# Altium schematic symbol library 13-Logicold 逻辑 IC.SchLib: 297 symbols (part 11 of 30) (continued)
## PIC16F877A-I/PT (continued)
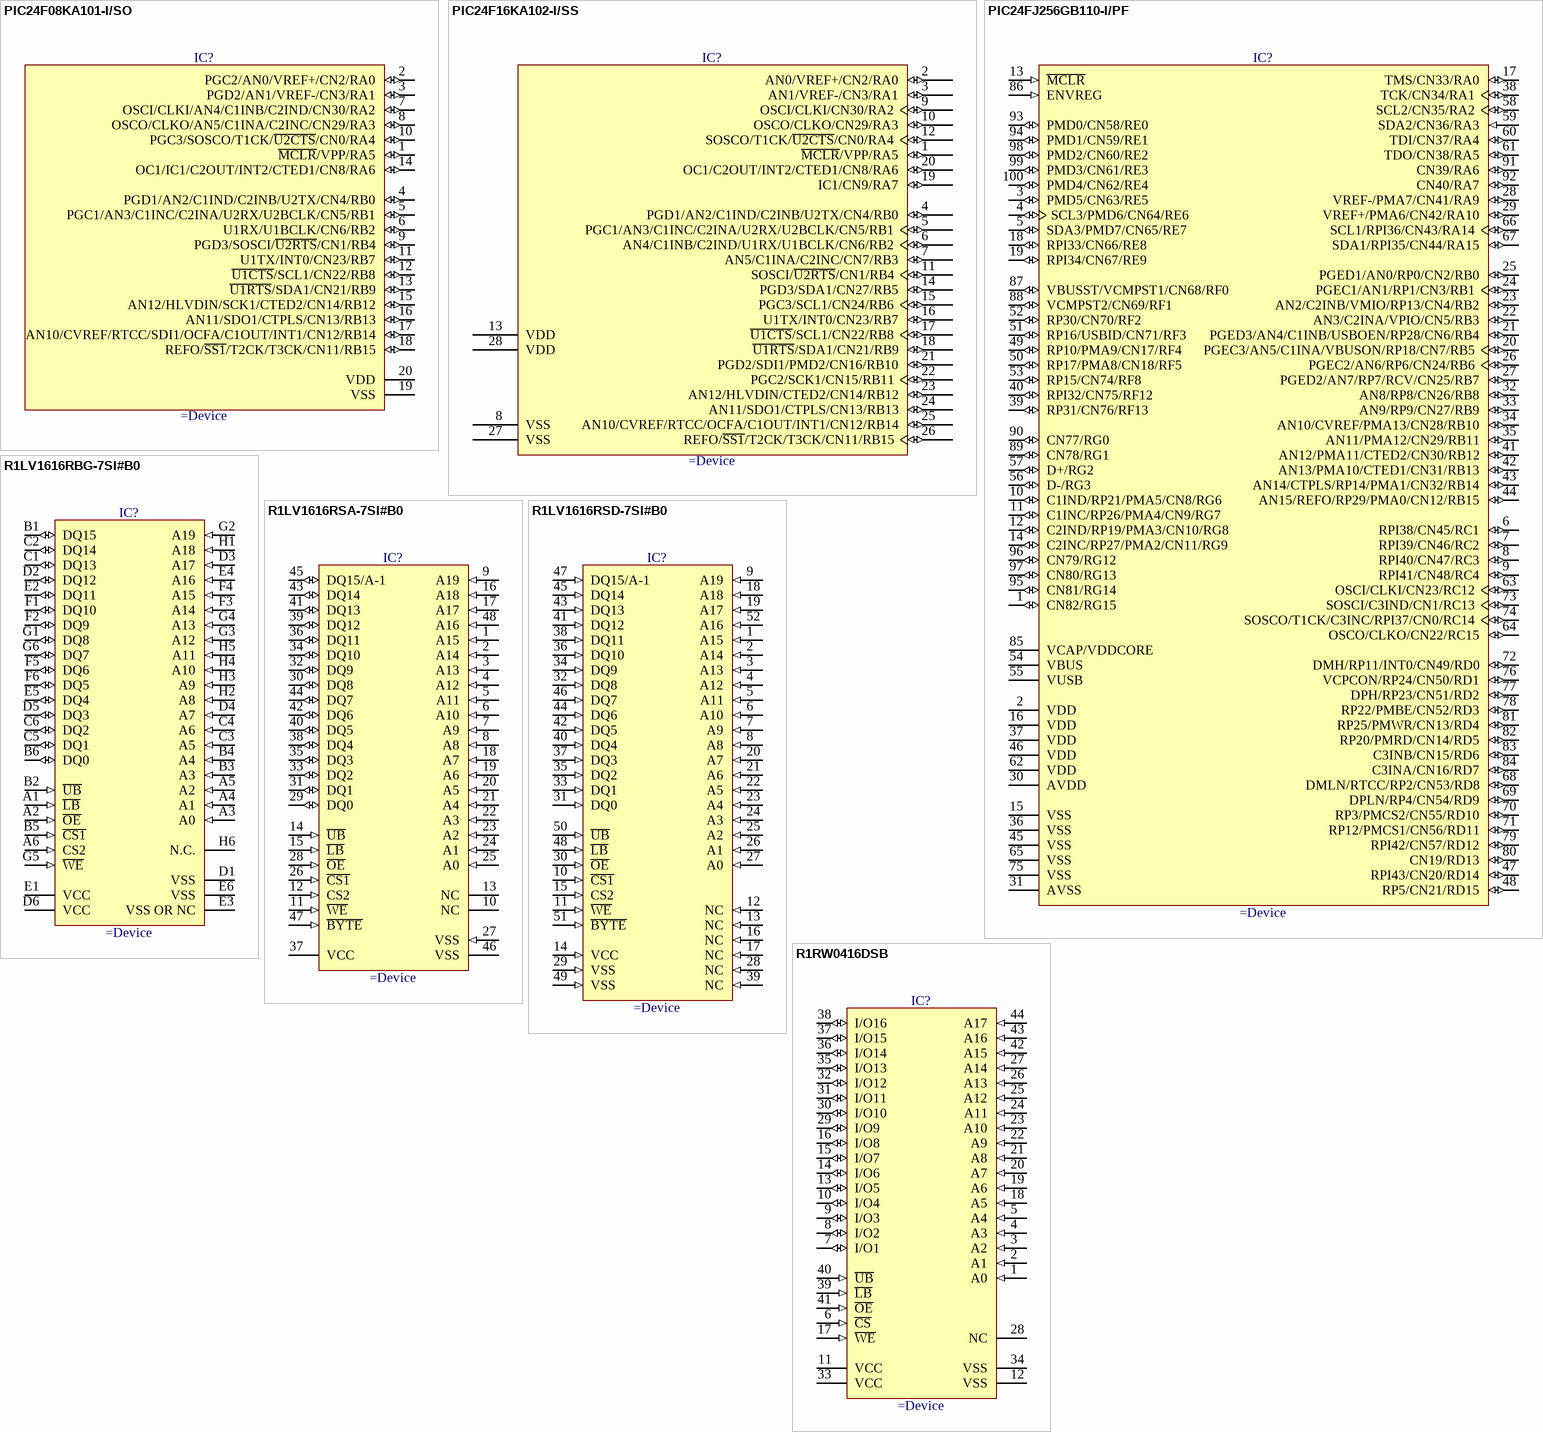
[diagram p68: symbols PIC24F08KA101-I/SO to R1RW0416DSB]

## PIC24F08KA101-I/SO
designator IC?
16-Bit Flash Microcontroller with nanoWatt XLP Technology, 8KB Flash, 1.5KB SRAM, 20-Pin SOIC, Industrial Temperature
pins: 1 ~{MCLR}/VPP/RA5 (io), 2 PGC2/AN0/VREF+/CN2/RA0 (io), 3 PGD2/AN1/VREF-/CN3/RA1 (io), 4 PGD1/AN2/C1IND/C2INB/U2TX/CN4/RB0 (io), 5 PGC1/AN3/C1INC/C2INA/U2RX/U2BCLK/CN5/RB1 (io), 6 U1RX/U1BCLK/CN6/RB2 (io), 7 OSCI/CLKI/AN4/C1INB/C2IND/CN30/RA2 (io), 8 OSCO/CLKO/AN5/C1INA/C2INC/CN29/RA3 (io), 9 PGD3/SOSCI/~{U2RTS}/CN1/RB4 (io), 10 PGC3/SOSCO/T1CK/~{U2CTS}/CN0/RA4 (io), 11 U1TX/INT0/CN23/RB7 (io), 12 ~{U1CTS}/SCL1/CN22/RB8 (io), 13 ~{U1RTS}/SDA1/CN21/RB9 (io), 14 OC1/IC1/C2OUT/INT2/CTED1/CN8/RA6 (io), 15 AN12/HLVDIN/SCK1/CTED2/CN14/RB12 (io), 16 AN11/SDO1/CTPLS/CN13/RB13 (io), 17 AN10/CVREF/RTCC/SDI1/OCFA/C1OUT/INT1/CN12/RB14 (io), 18 REFO/~{SS1}/T2CK/T3CK/CN11/RB15 (io), 19 VSS (power), 20 VDD (power)

## PIC24F16KA102-I/SS
designator IC?
16-Bit Flash Microcontroller with nanoWatt XLP Technology, 16KB Flash, 1.5KB SRAM, 28-Pin SSOP, Industrial Temperature
pins: 1 ~{MCLR}/VPP/RA5 (io), 2 AN0/VREF+/CN2/RA0 (io), 3 AN1/VREF-/CN3/RA1 (io), 4 PGD1/AN2/C1IND/C2INB/U2TX/CN4/RB0 (io), 5 PGC1/AN3/C1INC/C2INA/U2RX/U2BCLK/CN5/RB1 (io), 6 AN4/C1INB/C2IND/U1RX/U1BCLK/CN6/RB2 (io), 7 AN5/C1INA/C2INC/CN7/RB3 (io), 8 VSS (power), 9 OSCI/CLKI/CN30/RA2 (io), 10 OSCO/CLKO/CN29/RA3 (io), 11 SOSCI/~{U2RTS}/CN1/RB4 (io), 12 SOSCO/T1CK/~{U2CTS}/CN0/RA4 (io), 13 VDD (power), 14 PGD3/SDA1/CN27/RB5 (io), 15 PGC3/SCL1/CN24/RB6 (io), 16 U1TX/INT0/CN23/RB7 (io), 17 ~{U1CTS}/SCL1/CN22/RB8 (io), 18 ~{U1RTS}/SDA1/CN21/RB9 (io), 19 IC1/CN9/RA7 (io), 20 OC1/C2OUT/INT2/CTED1/CN8/RA6 (io), 21 PGD2/SDI1/PMD2/CN16/RB10 (io), 22 PGC2/SCK1/CN15/RB11 (io), 23 AN12/HLVDIN/CTED2/CN14/RB12 (io), 24 AN11/SDO1/CTPLS/CN13/RB13 (io), 25 AN10/CVREF/RTCC/OCFA/C1OUT/INT1/CN12/RB14 (io), 26 REFO/~{SS1}/T2CK/T3CK/CN11/RB15 (io), 27 VSS (power), 28 VDD (power)

## PIC24FJ256GB110-I/PF
designator IC?
General Purpose 16-Bit Flash Microcontroller with USB On-The-Go, 256KB Flash, 16KB SRAM, 100-Pin TQFP (14x14x1 mm), Industrial Temperature
pins: 1 CN82/RG15 (io), 2 VDD (power), 3 PMD5/CN63/RE5 (io), 4 SCL3/PMD6/CN64/RE6 (io), 5 SDA3/PMD7/CN65/RE7 (io), 6 RPI38/CN45/RC1 (io), 7 RPI39/CN46/RC2 (io), 8 RPI40/CN47/RC3 (io), 9 RPI41/CN48/RC4 (io), 10 C1IND/RP21/PMA5/CN8/RG6 (io), 11 C1INC/RP26/PMA4/CN9/RG7 (io), 12 C2IND/RP19/PMA3/CN10/RG8 (io), 13 ~{MCLR} (in), 14 C2INC/RP27/PMA2/CN11/RG9 (io), 15 VSS (power), 16 VDD (power), 17 TMS/CN33/RA0 (io), 18 RPI33/CN66/RE8 (io), 19 RPI34/CN67/RE9 (io), 20 PGEC3/AN5/C1INA/VBUSON/RP18/CN7/RB5 (io), 21 PGED3/AN4/C1INB/USBOEN/RP28/CN6/RB4 (io), 22 AN3/C2INA/VPIO/CN5/RB3 (io), 23 AN2/C2INB/VMIO/RP13/CN4/RB2 (io), 24 PGEC1/AN1/RP1/CN3/RB1 (io), 25 PGED1/AN0/RP0/CN2/RB0 (io), 26 PGEC2/AN6/RP6/CN24/RB6 (io), 27 PGED2/AN7/RP7/RCV/CN25/RB7 (io), 28 VREF-/PMA7/CN41/RA9 (io), 29 VREF+/PMA6/CN42/RA10 (io), 30 AVDD (power), 31 AVSS (power), 32 AN8/RP8/CN26/RB8 (io), 33 AN9/RP9/CN27/RB9 (io), 34 AN10/CVREF/PMA13/CN28/RB10 (io), 35 AN11/PMA12/CN29/RB11 (io), 36 VSS (power), 37 VDD (power), 38 TCK/CN34/RA1 (io), 39 RP31/CN76/RF13 (io), 40 RPI32/CN75/RF12 (io), 41 AN12/PMA11/CTED2/CN30/RB12 (io), 42 AN13/PMA10/CTED1/CN31/RB13 (io), 43 AN14/CTPLS/RP14/PMA1/CN32/RB14 (io), 44 AN15/REFO/RP29/PMA0/CN12/RB15 (io), 45 VSS (power), 46 VDD (power), 47 RPI43/CN20/RD14 (io), 48 RP5/CN21/RD15 (io), 49 RP10/PMA9/CN17/RF4 (io), 50 RP17/PMA8/CN18/RF5 (io), 51 RP16/USBID/CN71/RF3 (io), 52 RP30/CN70/RF2 (io), 53 RP15/CN74/RF8 (io), 54 VBUS (power), 55 VUSB (power), 56 D-/RG3 (io), 57 D+/RG2 (io), 58 SCL2/CN35/RA2 (io), 59 SDA2/CN36/RA3 (in), 60 TDI/CN37/RA4 (io), 61 TDO/CN38/RA5 (io), 62 VDD (power), 63 OSCI/CLKI/CN23/RC12 (io), 64 OSCO/CLKO/CN22/RC15 (io), 65 VSS (power), 66 SCL1/RPI36/CN43/RA14 (io), 67 SDA1/RPI35/CN44/RA15 (io), 68 DMLN/RTCC/RP2/CN53/RD8 (io), 69 DPLN/RP4/CN54/RD9 (io), 70 RP3/PMCS2/CN55/RD10 (io), 71 RP12/PMCS1/CN56/RD11 (io), 72 DMH/RP11/INT0/CN49/RD0 (io), 73 SOSCI/C3IND/CN1/RC13 (io), 74 SOSCO/T1CK/C3INC/RPI37/CN0/RC14 (io), 75 VSS (power), 76 VCPCON/RP24/CN50/RD1 (io), 77 DPH/RP23/CN51/RD2 (io), 78 RP22/PMBE/CN52/RD3 (io), 79 RPI42/CN57/RD12 (io), 80 CN19/RD13 (io), 81 RP25/PMWR/CN13/RD4 (io), 82 RP20/PMRD/CN14/RD5 (io), 83 C3INB/CN15/RD6 (io), 84 C3INA/CN16/RD7 (io), 85 VCAP/VDDCORE (power), 86 ENVREG (in), 87 VBUSST/VCMPST1/CN68/RF0 (io), 88 VCMPST2/CN69/RF1 (io), 89 CN78/RG1 (io), 90 CN77/RG0 (io), 91 CN39/RA6 (io), 92 CN40/RA7 (io), 93 PMD0/CN58/RE0 (io), 94 PMD1/CN59/RE1 (io), 95 CN81/RG14 (io), 96 CN79/RG12 (io), 97 CN80/RG13 (io), 98 PMD2/CN60/RE2 (io), 99 PMD3/CN61/RE3 (io), 100 PMD4/CN62/RE4 (io)

## R1LV1616RBG-7SI#B0
designator IC?
16Mb Advanced LPSRAM (1M Word x 16bit / 2M Wordx8bit)
pins: A1 ~{LB} (in), A2 ~{OE} (in), A3 A0 (in), A4 A1 (in), A5 A2 (in), A6 CS2 (in), B1 DQ15 (io), B2 ~{UB} (in), B3 A3 (in), B4 A4 (in), B5 ~{CS1} (in), B6 DQ0 (io), C1 DQ13 (io), C2 DQ14 (io), C3 A5 (in), C4 A6 (in), C5 DQ1 (io), C6 DQ2 (io), D1 VSS (power), D2 DQ12 (io), D3 A17 (in), D4 A7 (in), D5 DQ3 (io), D6 VCC (power), E1 VCC (power), E2 DQ11 (io), E3  VSS OR NC (power), E4 A16 (in), E5 DQ4 (io), E6 VSS (power), F1 DQ10 (io), F2 DQ9 (io), F3 A14 (in), F4 A15 (in), F5 DQ6 (io), F6 DQ5 (io), G1 DQ8 (io), G2 A19 (in), G3 A12 (in), G4 A13 (in), G5 ~{WE} (in), G6 DQ7 (io), H1 A18 (in), H2 A8 (in), H3 A9 (in), H4 A10 (in), H5 A11 (in), H6 N.C.

## R1LV1616RSA-7SI#B0
designator IC?
16Mb Advanced LPSRAM (1M Word x 16bit / 2M Wordx8bit)
pins: 1 A15 (in), 2 A14 (in), 3 A13 (in), 4 A12 (in), 5 A11 (in), 6 A10 (in), 7 A9 (in), 8 A8 (in), 9 A19 (in), 10 NC, 11 ~{WE} (in), 12 CS2 (in), 13 NC, 14 ~{UB} (in), 15 ~{LB} (in), 16 A18 (in), 17 A17 (in), 18 A7 (in), 19 A6 (in), 20 A5 (in), 21 A4 (in), 22 A3 (in), 23 A2 (in), 24 A1 (in), 25 A0 (in), 26 ~{CS1} (in), 27 VSS (in), 28 ~{OE} (in), 29 DQ0 (io), 30 DQ8 (io), 31 DQ1 (io), 32 DQ9 (io), 33 DQ2 (io), 34 DQ10 (io), 35 DQ3 (io), 36 DQ11 (io), 37 VCC (power), 38 DQ4 (io), 39 DQ12 (io), 40 DQ5 (io), 41 DQ13 (io), 42 DQ6 (io), 43 DQ14 (io), 44 DQ7 (io), 45 DQ15/A-1 (io), 46 VSS (power), 47 ~{BYTE} (in), 48 A16 (in)

## R1LV1616RSD-7SI#B0
designator IC?
16Mb Advanced LPSRAM (1M Word x 16bit / 2M Wordx8bit)
pins: 1 A15 (in), 2 A14 (in), 3 A13 (in), 4 A12 (in), 5 A11 (in), 6 A10 (in), 7 A9 (in), 8 A8 (in), 9 A19 (in), 10 ~{CS1} (in), 11 ~{WE} (in), 12 NC (in), 13 NC (in), 14 VCC (in), 15 CS2 (in), 16 NC (in), 17 NC (in), 18 A18 (in), 19 A17 (in), 20 A7 (in), 21 A6 (in), 22 A5 (in), 23 A4 (in), 24 A3 (in), 25 A2 (in), 26 A1 (in), 27 A0 (in), 28 NC (in), 29 VSS (in), 30 ~{OE} (in), 31 DQ0 (in), 32 DQ8 (in), 33 DQ1 (in), 34 DQ9 (in), 35 DQ2 (in), 36 DQ10 (in), 37 DQ3 (in), 38 DQ11 (in), 39 NC (in), 40 DQ4 (in), 41 DQ12 (in), 42 DQ5 (in), 43 DQ13 (in), 44 DQ6 (in), 45 DQ14 (in), 46 DQ7 (in), 47 DQ15/A-1 (in), 48 ~{LB} (in), 49 VSS (in), 50 ~{UB} (in), 51 ~{BYTE} (in), 52 A16 (in)

## R1RW0416DSB
designator IC?
4M High Speed SRAM (256-kword × 16-Bit)
pins: 1 A0 (in), 2 A1 (in), 3 A2 (in), 4 A3 (in), 5 A4 (in), 6 ~{CS} (in), 7 I/O1 (io), 8 I/O2 (io), 9 I/O3 (io), 10 I/O4 (io), 11 VCC (power), 12 VSS (power), 13 I/O5 (io), 14 I/O6 (io), 15 I/O7 (io), 16 I/O8 (io), 17 ~{WE} (in), 18 A5 (in), 19 A6 (in), 20 A7 (in), 21 A8 (in), 22 A9 (in), 23 A10 (in), 24 A11 (in), 25 A12 (in), 26 A13 (in), 27 A14 (in), 28 NC, 29 I/O9 (io), 30 I/O10 (io), 31 I/O11 (io), 32 I/O12 (io), 33 VCC (power), 34 VSS (power), 35 I/O13 (io), 36 I/O14 (io), 37 I/O15 (io), 38 I/O16 (io), 39 ~{LB} (in), 40 ~{UB} (in), 41 ~{OE} (in), 42 A15 (in), 43 A16 (in), 44 A17 (in)

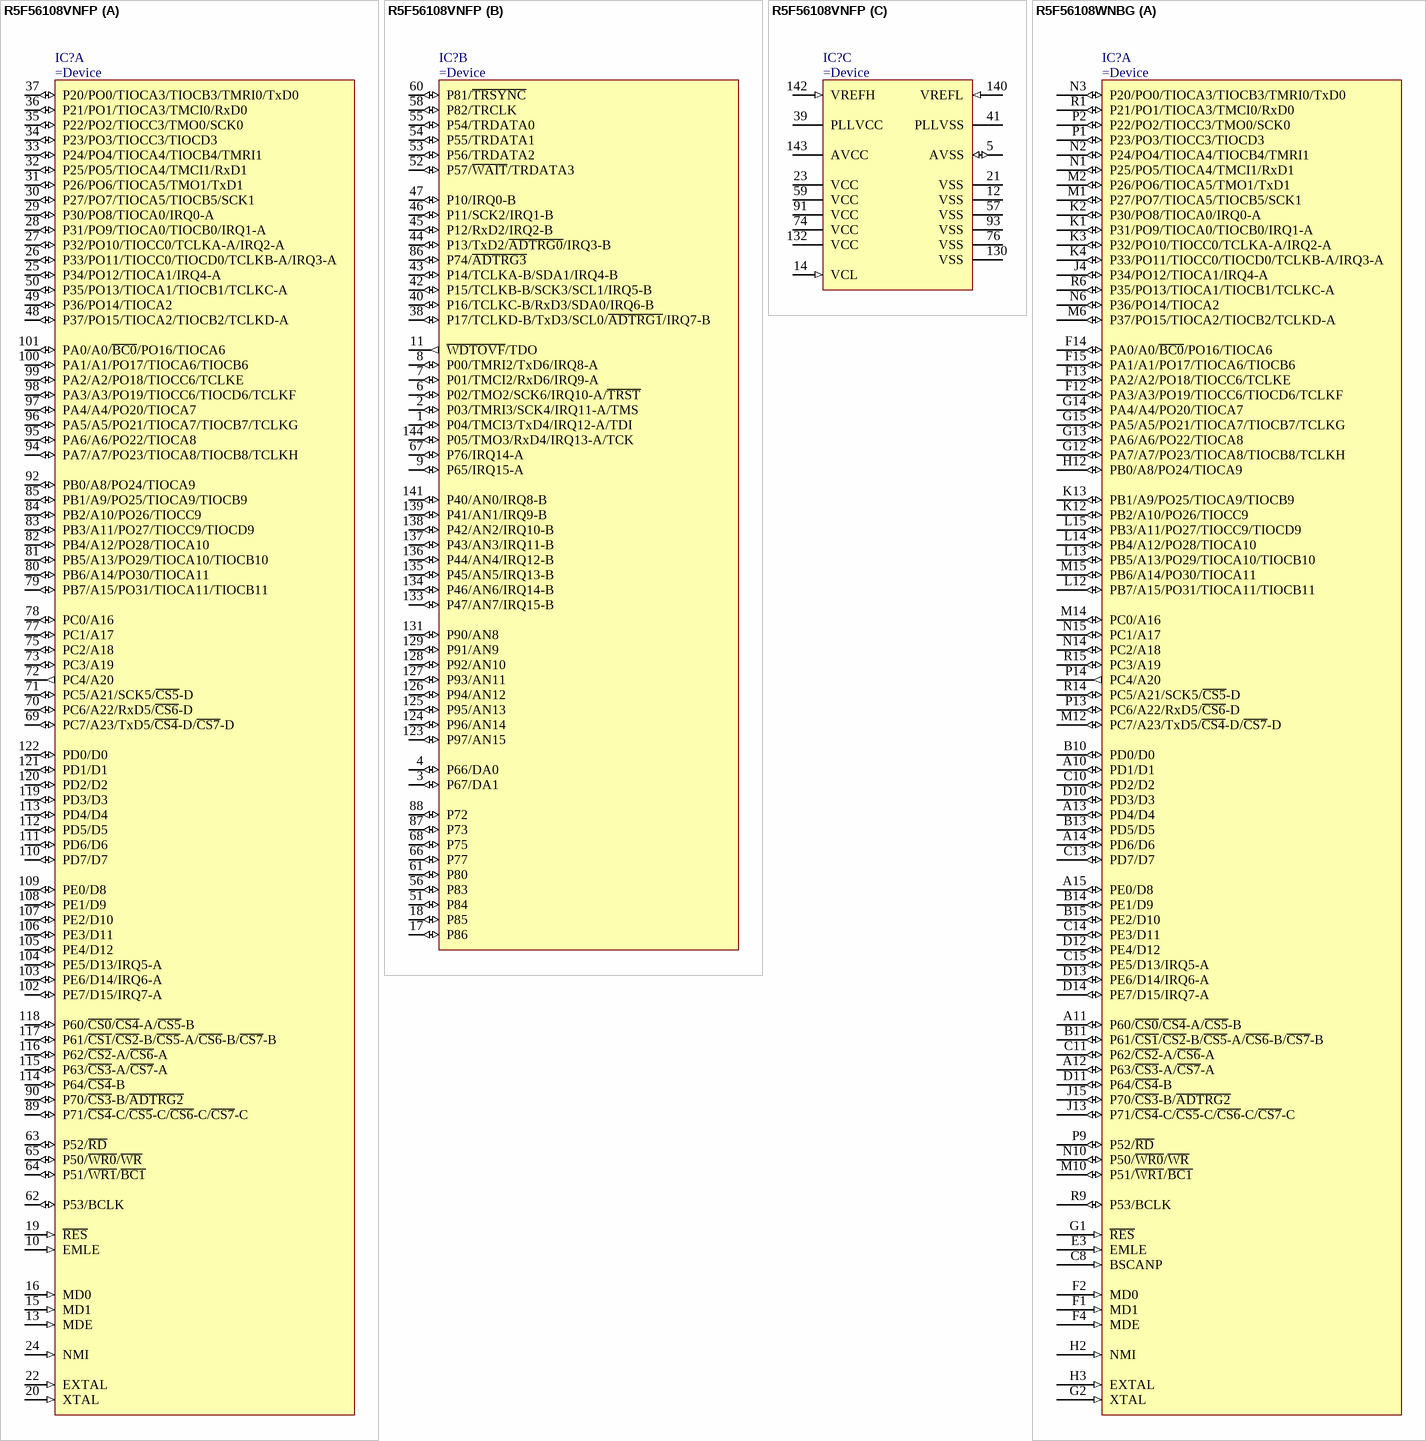
[diagram p69: symbols R5F56108VNFP to R5F56108WNBG]

## R5F56108VNFP
designator IC?
64-Bit, 2M ROM, 128K RAM, 32K Flash, 3V Microcontroller
part A pins: 10 EMLE (in), 13 MDE (in), 15 MD1 (in), 16 MD0 (in), 19 ~{RES} (in), 20 XTAL (in), 22 EXTAL (in), 24 NMI (in), 25 P34/PO12/TIOCA1/IRQ4-A (io), 26 P33/PO11/TIOCC0/TIOCD0/TCLKB-A/IRQ3-A (io), 27 P32/PO10/TIOCC0/TCLKA-A/IRQ2-A (io), 28 P31/PO9/TIOCA0/TIOCB0/IRQ1-A (io), 29 P30/PO8/TIOCA0/IRQ0-A (io), 30 P27/PO7/TIOCA5/TIOCB5/SCK1 (io), 31 P26/PO6/TIOCA5/TMO1/TxD1 (io), 32 P25/PO5/TIOCA4/TMCI1/RxD1 (io), 33 P24/PO4/TIOCA4/TIOCB4/TMRI1 (io), 34 P23/PO3/TIOCC3/TIOCD3 (io), 35 P22/PO2/TIOCC3/TMO0/SCK0 (io), 36 P21/PO1/TIOCA3/TMCI0/RxD0 (io), 37 P20/PO0/TIOCA3/TIOCB3/TMRI0/TxD0 (io), 48 P37/PO15/TIOCA2/TIOCB2/TCLKD-A (io), 49 P36/PO14/TIOCA2 (io), 50 P35/PO13/TIOCA1/TIOCB1/TCLKC-A (io), 62 P53/BCLK (io), 63 P52/~{RD} (io), 64 P51/~{WR1}/~{BC1} (io), 65 P50/~{WR0}/~{WR} (io), 69 PC7/A23/TxD5/~{CS4}-D/~{CS7}-D (io), 70 PC6/A22/RxD5/~{CS6}-D (io), 71 PC5/A21/SCK5/~{CS5}-D (io), 72 PC4/A20 (out), 73 PC3/A19 (io), 75 PC2/A18 (io), 77 PC1/A17 (io), 78 PC0/A16 (io), 79 PB7/A15/PO31/TIOCA11/TIOCB11 (io), 80 PB6/A14/PO30/TIOCA11 (io), 81 PB5/A13/PO29/TIOCA10/TIOCB10 (io), 82 PB4/A12/PO28/TIOCA10 (io), 83 PB3/A11/PO27/TIOCC9/TIOCD9 (io), 84 PB2/A10/PO26/TIOCC9 (io), 85 PB1/A9/PO25/TIOCA9/TIOCB9 (io), 89 P71/~{CS4}-C/~{CS5}-C/~{CS6}-C/~{CS7}-C (io), 90 P70/~{CS3}-B/~{ADTRG2} (io), 92 PB0/A8/PO24/TIOCA9 (io), 94 PA7/A7/PO23/TIOCA8/TIOCB8/TCLKH (io), 95 PA6/A6/PO22/TIOCA8 (io), 96 PA5/A5/PO21/TIOCA7/TIOCB7/TCLKG (io), 97 PA4/A4/PO20/TIOCA7 (io), 98 PA3/A3/PO19/TIOCC6/TIOCD6/TCLKF (io), 99 PA2/A2/PO18/TIOCC6/TCLKE (io), 100 PA1/A1/PO17/TIOCA6/TIOCB6 (io), 101 PA0/A0/~{BC0}/PO16/TIOCA6 (io), 102 PE7/D15/IRQ7-A (io), 103 PE6/D14/IRQ6-A (io), 104 PE5/D13/IRQ5-A (io), 105 PE4/D12 (io), 106 PE3/D11 (io), 107 PE2/D10 (io), 108 PE1/D9 (io), 109 PE0/D8 (io), 110 PD7/D7 (io), 111 PD6/D6 (io), 112 PD5/D5 (io), 113 PD4/D4 (io), 114 P64/~{CS4}-B (io), 115 P63/~{CS3}-A/~{CS7}-A (io), 116 P62/~{CS2}-A/~{CS6}-A (io), 117 P61/~{CS1}/~{CS2}-B/~{CS5}-A/~{CS6}-B/~{CS7}-B (io), 118 P60/~{CS0}/~{CS4}-A/~{CS5}-B (io), 119 PD3/D3 (io), 120 PD2/D2 (io), 121 PD1/D1 (io), 122 PD0/D0 (io)
part B pins: 1 P04/TMCI3/TxD4/IRQ12-A/TDI (io), 2 P03/TMRI3/SCK4/IRQ11-A/TMS (io), 3 P67/DA1 (io), 4 P66/DA0 (io), 6 P02/TMO2/SCK6/IRQ10-A/~{TRST} (io), 7 P01/TMCI2/RxD6/IRQ9-A (io), 8 P00/TMRI2/TxD6/IRQ8-A (io), 9 P65/IRQ15-A (io), 11 ~{WDTOVF}/TDO (out), 17 P86 (io), 18 P85 (io), 38 P17/TCLKD-B/TxD3/SCL0/~{ADTRG1}/IRQ7-B (io), 40 P16/TCLKC-B/RxD3/SDA0/IRQ6-B (io), 42 P15/TCLKB-B/SCK3/SCL1/IRQ5-B (io), 43 P14/TCLKA-B/SDA1/IRQ4-B (io), 44 P13/TxD2/~{ADTRG0}/IRQ3-B (io), 45 P12/RxD2/IRQ2-B (io), 46 P11/SCK2/IRQ1-B (io), 47 P10/IRQ0-B (io), 51 P84 (io), 52 P57/~{WAIT}/TRDATA3 (io), 53 P56/TRDATA2 (io), 54 P55/TRDATA1 (io), 55 P54/TRDATA0 (io), 56 P83 (io), 58 P82/TRCLK (io), 60 P81/~{TRSYNC} (io), 61 P80 (io), 66 P77 (io), 67 P76/IRQ14-A (io), 68 P75 (io), 86 P74/~{ADTRG3} (io), 87 P73 (io), 88 P72 (io), 123 P97/AN15 (io), 124 P96/AN14 (io), 125 P95/AN13 (io), 126 P94/AN12 (io), 127 P93/AN11 (io), 128 P92/AN10 (io), 129 P91/AN9 (io), 131 P90/AN8 (io), 133 P47/AN7/IRQ15-B (io), 134 P46/AN6/IRQ14-B (io), 135 P45/AN5/IRQ13-B (io), 136 P44/AN4/IRQ12-B (io), 137 P43/AN3/IRQ11-B (io), 138 P42/AN2/IRQ10-B (io), 139 P41/AN1/IRQ9-B (io), 141 P40/AN0/IRQ8-B (io), 144 P05/TMO3/RxD4/IRQ13-A/TCK (io)
part C pins: 5 AVSS (io), 12 VSS (power), 14 VCL (in), 21 VSS (power), 23 VCC (power), 39 PLLVCC (power), 41 PLLVSS (power), 57 VSS (power), 59 VCC (power), 74 VCC (power), 76 VSS (power), 91 VCC (power), 93 VSS (power), 130 VSS (power), 132 VCC (power), 140 VREFL (in), 142 VREFH (in), 143 AVCC (power)

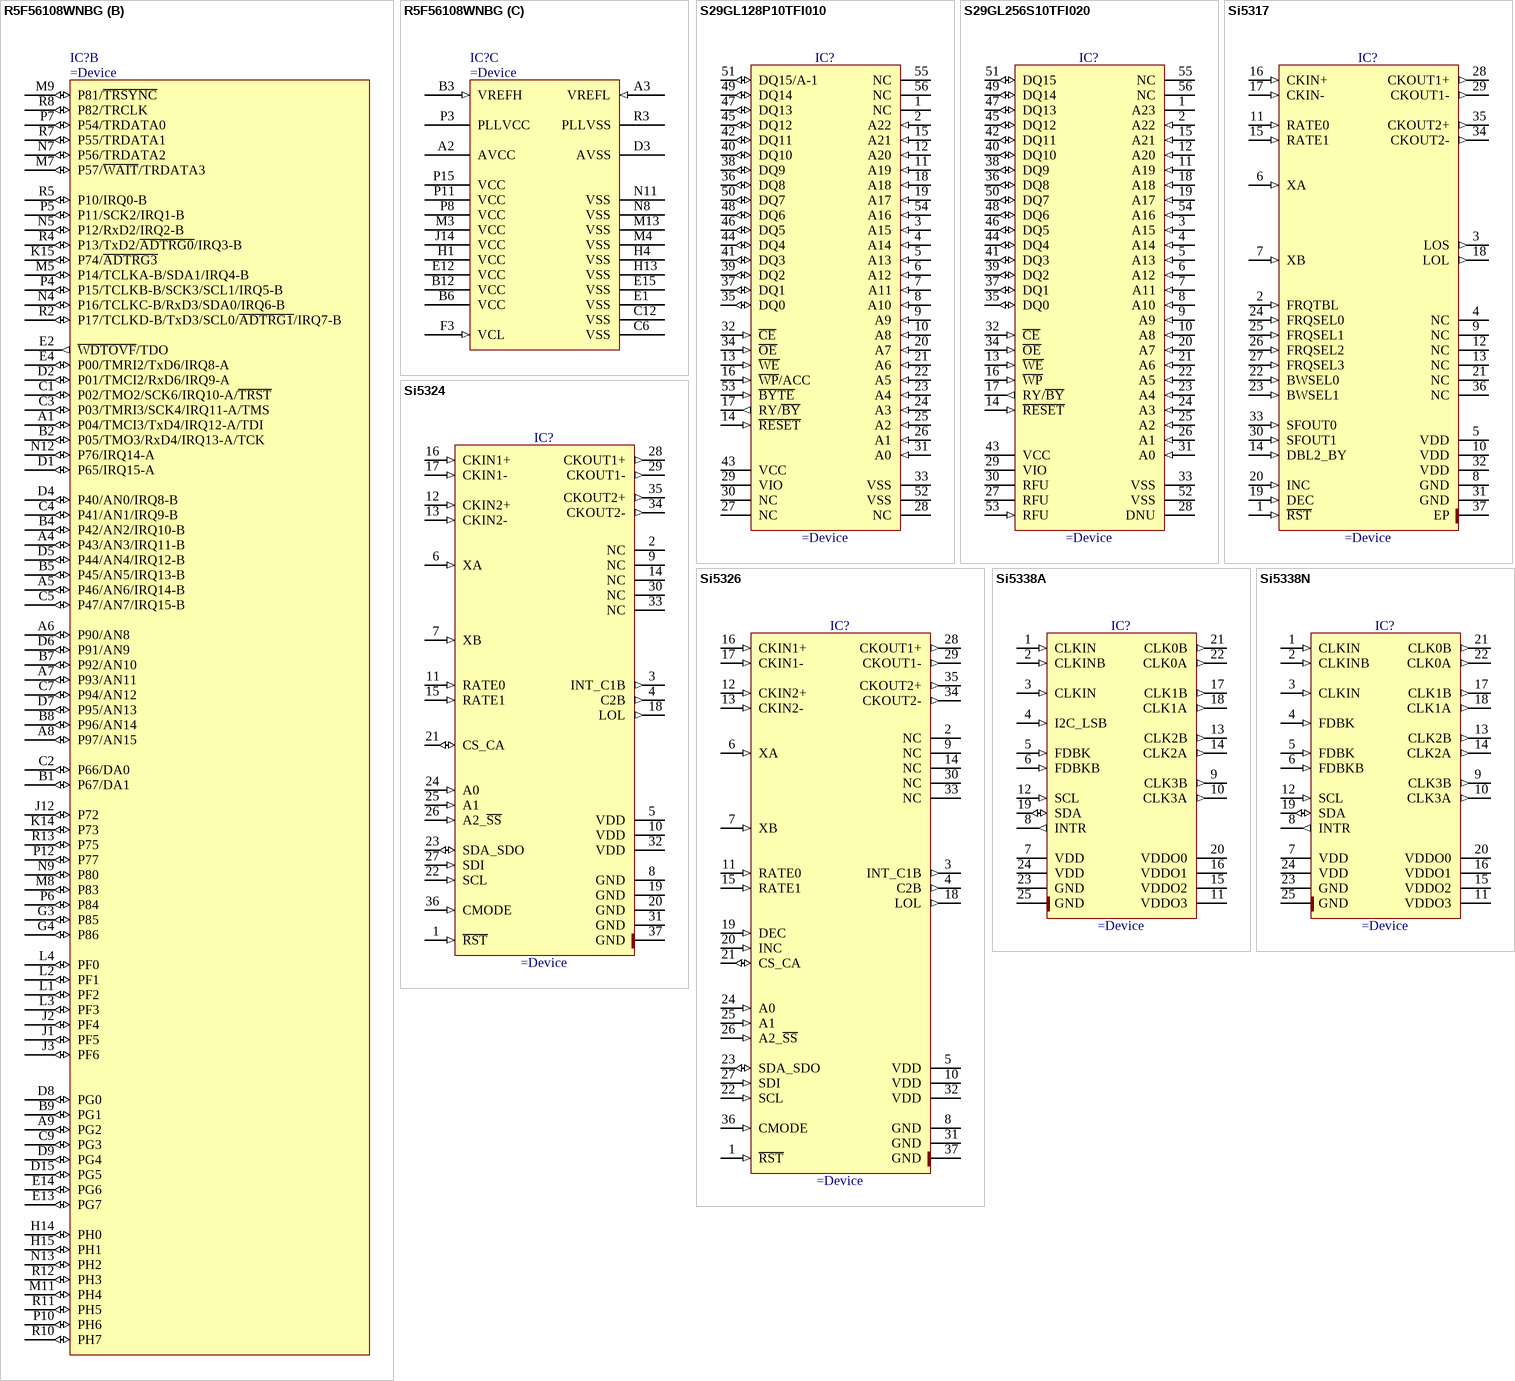
[diagram p70: symbols R5F56108WNBG to Si5338N]